# Altium schematic symbol library IC_ADI.SCHLIB: 3169 symbols (part 40 of 181)
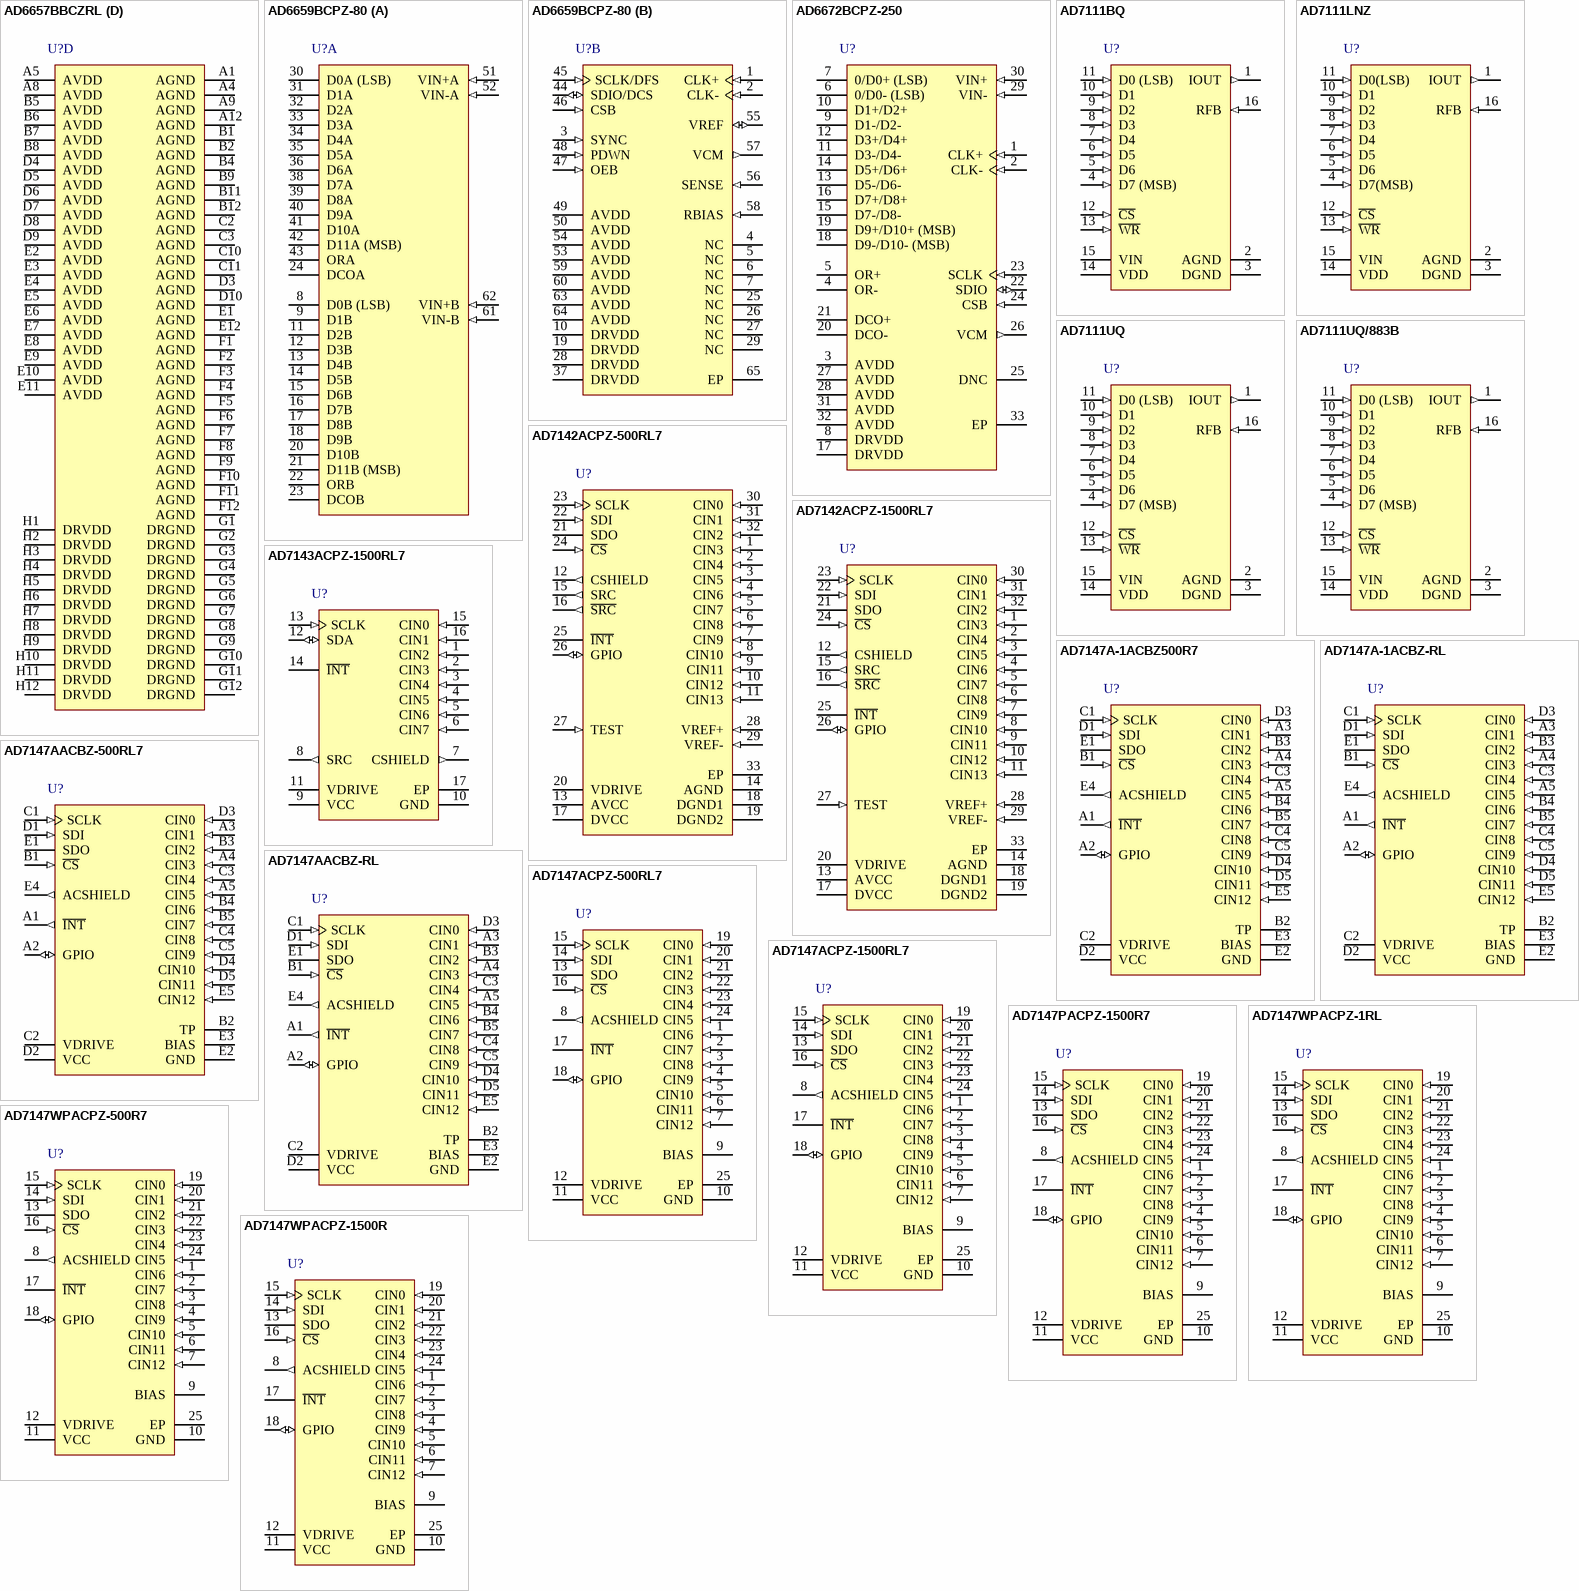
[diagram p230: symbols AD6657BBCZRL to AD7147WPACPZ-1500R]

## AD7147A-1ACBZ500R7
designator U?
13 Channel CapTouch Programmable Controller for Single-Electrode Capacitance Sensors, 111SPS, -40 to +85 degC, CB-25-3, Pb-Free, Reel; Generic Part Number: AD7147A; PartNumber: AD7147A-1ACBZ500R7; Resolution (Bits): 16; Channels: 13; Throughput Rate (SPS): 111; Interface: I2C/Ser 2-Wire, Ser, SPI; DatasheetVersion: Rev.B; PackageVersion: 081908-A; PackageReference: CB-25-3; PackageDescription: 25-Ball Wafer Level Chip Scale Package [WLCSP]; Supplier Part Number 1: AD7147A-1ACBZ500R7TR-ND; Supplier Part Number 2: AD7147A-1ACBZ500R7CT-ND; Supplier Part Number 3: AD7147A-1ACBZ500R7DKR-ND; Supplier Part Number 4: 05R6583; Supplier Part Number 5: 584-A7147A1ACBZ500R7; RoHS: Y; Packing: Reel; Mounting Technology: Surface Mount; ComponentLink1Description: Manufacturer URL; ComponentLink2Description: Datasheet; ComponentLink3Description: Package Specification; ComponentLink4Description: Product URL
footprint BGA25_0.4(2X2.2) (Footprint not found)
pins: A1 ~{INT} (out) "General-Purpose Open-Drain Interrupt Output. Programmable polarity; requires pull-up resistor.", A2 GPIO (io) "Programmable General-Purpose Input/Output.", A3 CIN1 (in) "Capacitance Sensor Input.", A4 CIN3 (in) "Capacitance Sensor Input.", A5 CIN5 (in) "Capacitance Sensor Input.", B1 ~{CS} (in) "SPI Chip Select Signal.", B2 TP (power) "Factory Test Point Only. Tie to ground.", B3 CIN2 (in) "Capacitance Sensor Input.", B4 CIN6 (in) "Capacitance Sensor Input.", B5 CIN7 (in) "Capacitance Sensor Input.", C1 SCLK (in) "Clock Input for Serial Interface.", C2 VDRIVE (power) "Serial Interface Operating Voltage Supply.", C3 CIN4 (in) "Capacitance Sensor Input.", C4 CIN8 (in) "Capacitance Sensor Input.", C5 CIN9 (in) "Capacitance Sensor Input.", D1 SDI (in) "SPI Serial Data Input.", D2 VCC (power) "Supply Voltage.", D3 CIN0 (in) "Capacitance Sensor Input.", D4 CIN10 (in) "Capacitance Sensor Input.", D5 CIN11 (in) "Capacitance Sensor Input.", E1 SDO (hiz) "SPI Serial Data Output.", E2 GND (power) "Ground Reference Point for All Circuitry.", E3 BIAS "Bias Node for Internal Circuitry. Requires 100 nF capacitor to ground.", E4 ACSHIELD (out) "CDC Active Shield Output. Connect to external shield or plane.", E5 CIN12 (in) "Capacitance Sensor Input."

## AD7147A-1ACBZ-RL
designator U?
13 Channel CapTouch Programmable Controller for Single-Electrode Capacitance Sensors, 111SPS, -40 to +85 degC, CB-25-3, Pb-Free, Reel; Generic Part Number: AD7147A; PartNumber: AD7147A-1ACBZ-RL; Resolution (Bits): 16; Channels: 13; Throughput Rate (SPS): 111; Interface: I2C/Ser 2-Wire, Ser, SPI; DatasheetVersion: Rev.B; PackageVersion: 081908-A; PackageReference: CB-25-3; PackageDescription: 25-Ball Wafer Level Chip Scale Package [WLCSP]; Supplier Part Number 1: AD7147A-1ACBZ-RL-ND; Supplier Part Number 2: 584-AD7147A-1ACBZ-R; RoHS: Y; Packing: Reel; Mounting Technology: Surface Mount; ComponentLink1Description: Manufacturer URL; ComponentLink2Description: Datasheet; ComponentLink3Description: Package Specification; ComponentLink4Description: Product URL
footprint BGA25_0.4(2X2.2) (Footprint not found)
pins: A1 ~{INT} (out) "General-Purpose Open-Drain Interrupt Output. Programmable polarity; requires pull-up resistor.", A2 GPIO (io) "Programmable General-Purpose Input/Output.", A3 CIN1 (in) "Capacitance Sensor Input.", A4 CIN3 (in) "Capacitance Sensor Input.", A5 CIN5 (in) "Capacitance Sensor Input.", B1 ~{CS} (in) "SPI Chip Select Signal.", B2 TP (power) "Factory Test Point Only. Tie to ground.", B3 CIN2 (in) "Capacitance Sensor Input.", B4 CIN6 (in) "Capacitance Sensor Input.", B5 CIN7 (in) "Capacitance Sensor Input.", C1 SCLK (in) "Clock Input for Serial Interface.", C2 VDRIVE (power) "Serial Interface Operating Voltage Supply.", C3 CIN4 (in) "Capacitance Sensor Input.", C4 CIN8 (in) "Capacitance Sensor Input.", C5 CIN9 (in) "Capacitance Sensor Input.", D1 SDI (in) "SPI Serial Data Input.", D2 VCC (power) "Supply Voltage.", D3 CIN0 (in) "Capacitance Sensor Input.", D4 CIN10 (in) "Capacitance Sensor Input.", D5 CIN11 (in) "Capacitance Sensor Input.", E1 SDO (hiz) "SPI Serial Data Output.", E2 GND (power) "Ground Reference Point for All Circuitry.", E3 BIAS "Bias Node for Internal Circuitry. Requires 100 nF capacitor to ground.", E4 ACSHIELD (out) "CDC Active Shield Output. Connect to external shield or plane.", E5 CIN12 (in) "Capacitance Sensor Input."

## AD7147AACBZ-500RL7
designator U?
13 Channel CapTouch Programmable Controller for Single-Electrode Capacitance Sensors, 111SPS, -40 to +85 degC, CB-25-3, Pb-Free, Reel; Generic Part Number: AD7147A; PartNumber: AD7147AACBZ-500RL7; Resolution (Bits): 16; Channels: 13; Throughput Rate (SPS): 111; Interface: I2C/Ser 2-Wire, Ser, SPI; DatasheetVersion: Rev.B; PackageVersion: 081908-A; PackageReference: CB-25-3; PackageDescription: 25-Ball Wafer Level Chip Scale Package [WLCSP]; Supplier Part Number 1: AD7147AACBZ-500RL7TR-ND; Supplier Part Number 2: AD7147AACBZ-500RL7CT-ND; Supplier Part Number 3: AD7147AACBZ-500RL7DKR-ND; Supplier Part Number 4: 05R6584; Supplier Part Number 5: 584-AD7147AACBZ500R7; RoHS: Y; Packing: Reel; Mounting Technology: Surface Mount; ComponentLink1Description: Manufacturer URL; ComponentLink2Description: Datasheet; ComponentLink3Description: Package Specification; ComponentLink4Description: Product URL
footprint BGA25_0.4(2X2.2) (Footprint not found)
pins: A1 ~{INT} (out) "General-Purpose Open-Drain Interrupt Output. Programmable polarity; requires pull-up resistor.", A2 GPIO (io) "Programmable General-Purpose Input/Output.", A3 CIN1 (in) "Capacitance Sensor Input.", A4 CIN3 (in) "Capacitance Sensor Input.", A5 CIN5 (in) "Capacitance Sensor Input.", B1 ~{CS} (in) "SPI Chip Select Signal.", B2 TP (power) "Factory Test Point Only. Tie to ground.", B3 CIN2 (in) "Capacitance Sensor Input.", B4 CIN6 (in) "Capacitance Sensor Input.", B5 CIN7 (in) "Capacitance Sensor Input.", C1 SCLK (in) "Clock Input for Serial Interface.", C2 VDRIVE (power) "Serial Interface Operating Voltage Supply.", C3 CIN4 (in) "Capacitance Sensor Input.", C4 CIN8 (in) "Capacitance Sensor Input.", C5 CIN9 (in) "Capacitance Sensor Input.", D1 SDI (in) "SPI Serial Data Input.", D2 VCC (power) "Supply Voltage.", D3 CIN0 (in) "Capacitance Sensor Input.", D4 CIN10 (in) "Capacitance Sensor Input.", D5 CIN11 (in) "Capacitance Sensor Input.", E1 SDO (hiz) "SPI Serial Data Output.", E2 GND (power) "Ground Reference Point for All Circuitry.", E3 BIAS "Bias Node for Internal Circuitry. Requires 100 nF capacitor to ground.", E4 ACSHIELD (out) "CDC Active Shield Output. Connect to external shield or plane.", E5 CIN12 (in) "Capacitance Sensor Input."

## AD7147AACBZ-RL
designator U?
13 Channel CapTouch Programmable Controller for Single-Electrode Capacitance Sensors, 111SPS, -40 to +85 degC, CB-25-3, Pb-Free, Reel; Generic Part Number: AD7147A; PartNumber: AD7147AACBZ-RL; Resolution (Bits): 16; Channels: 13; Throughput Rate (SPS): 111; Interface: I2C/Ser 2-Wire, Ser, SPI; DatasheetVersion: Rev.B; PackageVersion: 081908-A; PackageReference: CB-25-3; PackageDescription: 25-Ball Wafer Level Chip Scale Package [WLCSP]; Supplier Part Number 1: AD7147AACBZ-RL-ND; Supplier Part Number 2: 33R2708; Supplier Part Number 3: 584-AD7147AACBZ-R; RoHS: Y; Packing: Reel; Mounting Technology: Surface Mount; ComponentLink1Description: Manufacturer URL; ComponentLink2Description: Datasheet; ComponentLink3Description: Package Specification; ComponentLink4Description: Product URL
footprint BGA25_0.4(2X2.2) (Footprint not found)
pins: A1 ~{INT} (out) "General-Purpose Open-Drain Interrupt Output. Programmable polarity; requires pull-up resistor.", A2 GPIO (io) "Programmable General-Purpose Input/Output.", A3 CIN1 (in) "Capacitance Sensor Input.", A4 CIN3 (in) "Capacitance Sensor Input.", A5 CIN5 (in) "Capacitance Sensor Input.", B1 ~{CS} (in) "SPI Chip Select Signal.", B2 TP (power) "Factory Test Point Only. Tie to ground.", B3 CIN2 (in) "Capacitance Sensor Input.", B4 CIN6 (in) "Capacitance Sensor Input.", B5 CIN7 (in) "Capacitance Sensor Input.", C1 SCLK (in) "Clock Input for Serial Interface.", C2 VDRIVE (power) "Serial Interface Operating Voltage Supply.", C3 CIN4 (in) "Capacitance Sensor Input.", C4 CIN8 (in) "Capacitance Sensor Input.", C5 CIN9 (in) "Capacitance Sensor Input.", D1 SDI (in) "SPI Serial Data Input.", D2 VCC (power) "Supply Voltage.", D3 CIN0 (in) "Capacitance Sensor Input.", D4 CIN10 (in) "Capacitance Sensor Input.", D5 CIN11 (in) "Capacitance Sensor Input.", E1 SDO (hiz) "SPI Serial Data Output.", E2 GND (power) "Ground Reference Point for All Circuitry.", E3 BIAS "Bias Node for Internal Circuitry. Requires 100 nF capacitor to ground.", E4 ACSHIELD (out) "CDC Active Shield Output. Connect to external shield or plane.", E5 CIN12 (in) "Capacitance Sensor Input."

## AD7147ACPZ-500RL7
designator U?
13 Channel CapTouch Programmable Controller for Single-Electrode Capacitance Sensors, 111SPS, -40 to +85 degC, CP-24-3, Pb-Free, Reel; Generic Part Number: AD7147; PartNumber: AD7147ACPZ-500RL7; Resolution (Bits): 16; Channels: 13; Throughput Rate (SPS): 111; Interface: I2C/Ser 2-Wire, Ser, SPI; Automotive Qualified: Yes; DatasheetVersion: Rev.D; PackageVersion: Jan-2005; PackageReference: CP-24-3; PackageDescription: 24-Lead Lead Frame Chip Scale Package [LFCSP_VQ] 4 x 4 mm Body, Very Thin Quad; Supplier Part Number 1: AD7147ACPZ-500RL7TR-ND; Supplier Part Number 2: AD7147ACPZ-500RL7CT-ND; Supplier Part Number 3: AD7147ACPZ-500RL7DKR-ND; Supplier Part Number 4: 1699634; Supplier Part Number 5: 61M4035; Supplier Part Number 6: 584-AD7147ACPZ-500R7; RoHS: Y; Packing: Reel; Mounting Technology: Surface Mount; Code_JEDEC: MO-220-VGGD-8; ComponentLink1Description: Manufacturer URL; ComponentLink2Description: Datasheet; ComponentLink3Description: Package Specification; ComponentLink4Description: Product URL
footprint QFN24_0.5-PAD(4X4) (Footprint not found)
pins: 1 CIN6 (in) "Capacitance Sensor Input.", 2 CIN7 (in) "Capacitance Sensor Input.", 3 CIN8 (in) "Capacitance Sensor Input.", 4 CIN9 (in) "Capacitance Sensor Input.", 5 CIN10 (in) "Capacitance Sensor Input.", 6 CIN11 (in) "Capacitance Sensor Input.", 7 CIN12 (in) "Capacitance Sensor Input.", 8 ACSHIELD (out) "CDC Active Shield Output. Connect to external shield or plane.", 9 BIAS "Bias Node for Internal Circuitry. Requires 100 nF capacitor to ground.", 10 GND (power) "Ground Reference Point for All Circuitry.", 11 VCC (power) "Supply Voltage.", 12 VDRIVE (power) "Serial Interface Operating Voltage Supply.", 13 SDO (hiz) "SPI Serial Data Output.", 14 SDI (in) "SPI Serial Data Input.", 15 SCLK (in) "Clock Input for Serial Interface.", 16 ~{CS} (in) "SPI Chip Select Signal.", 17 ~{INT} (oc) "General-Purpose Open-Drain Interrupt Output. Programmable polarity; requires pull-up resistor.", 18 GPIO (io) "Programmable GPIO.", 19 CIN0 (in) "Capacitance Sensor Input.", 20 CIN1 (in) "Capacitance Sensor Input.", 21 CIN2 (in) "Capacitance Sensor Input.", 22 CIN3 (in) "Capacitance Sensor Input.", 23 CIN4 (in) "Capacitance Sensor Input.", 24 CIN5 (in) "Capacitance Sensor Input.", 25 EP (power) "Capacitance Sensor Input."

## AD7147ACPZ-1500RL7
designator U?
13 Channel CapTouch Programmable Controller for Single-Electrode Capacitance Sensors, 111SPS, -40 to +85 degC, CP-24-3, Pb-Free, Reel; Generic Part Number: AD7147; PartNumber: AD7147ACPZ-1500RL7; Resolution (Bits): 16; Channels: 13; Throughput Rate (SPS): 111; Interface: I2C/Ser 2-Wire, Ser, SPI; Automotive Qualified: Yes; DatasheetVersion: Rev.D; PackageVersion: Jan-2005; PackageReference: CP-24-3; PackageDescription: 24-Lead Lead Frame Chip Scale Package [LFCSP_VQ] 4 x 4 mm Body, Very Thin Quad; Supplier Part Number 1: AD7147ACPZ-1500RL7TR-ND; Supplier Part Number 2: AD7147ACPZ-1500RL7CT-ND; Supplier Part Number 3: AD7147ACPZ-1500RL7DKR-ND; Supplier Part Number 4: 1838856; Supplier Part Number 5: 61M4034; Supplier Part Number 6: 584-AD7147ACPZ1500R7; RoHS: Y; Packing: Reel; Mounting Technology: Surface Mount; Code_JEDEC: MO-220-VGGD-8; ComponentLink1Description: Manufacturer URL; ComponentLink2Description: Datasheet; ComponentLink3Description: Package Specification; ComponentLink4Description: Product URL
footprint QFN24_0.5-PAD(4X4) (Footprint not found)
pins: 1 CIN6 (in) "Capacitance Sensor Input.", 2 CIN7 (in) "Capacitance Sensor Input.", 3 CIN8 (in) "Capacitance Sensor Input.", 4 CIN9 (in) "Capacitance Sensor Input.", 5 CIN10 (in) "Capacitance Sensor Input.", 6 CIN11 (in) "Capacitance Sensor Input.", 7 CIN12 (in) "Capacitance Sensor Input.", 8 ACSHIELD (out) "CDC Active Shield Output. Connect to external shield or plane.", 9 BIAS "Bias Node for Internal Circuitry. Requires 100 nF capacitor to ground.", 10 GND (power) "Ground Reference Point for All Circuitry.", 11 VCC (power) "Supply Voltage.", 12 VDRIVE (power) "Serial Interface Operating Voltage Supply.", 13 SDO (hiz) "SPI Serial Data Output.", 14 SDI (in) "SPI Serial Data Input.", 15 SCLK (in) "Clock Input for Serial Interface.", 16 ~{CS} (in) "SPI Chip Select Signal.", 17 ~{INT} (oc) "General-Purpose Open-Drain Interrupt Output. Programmable polarity; requires pull-up resistor.", 18 GPIO (io) "Programmable GPIO.", 19 CIN0 (in) "Capacitance Sensor Input.", 20 CIN1 (in) "Capacitance Sensor Input.", 21 CIN2 (in) "Capacitance Sensor Input.", 22 CIN3 (in) "Capacitance Sensor Input.", 23 CIN4 (in) "Capacitance Sensor Input.", 24 CIN5 (in) "Capacitance Sensor Input.", 25 EP (power) "Capacitance Sensor Input."

## AD7147PACPZ-1500R7
designator U?
13 Channel CapTouch Programmable Controller for Single-Electrode Capacitance Sensors, 111SPS, -40 to +85 degC, CP-24-3, Pb-Free, Reel; Generic Part Number: AD7147; PartNumber: AD7147PACPZ-1500R7; Resolution (Bits): 16; Channels: 13; Throughput Rate (SPS): 111; Interface: I2C/Ser 2-Wire, Ser, SPI; Automotive Qualified: Yes; DatasheetVersion: Rev.D; PackageVersion: Jan-2005; PackageReference: CP-24-3; PackageDescription: 24-Lead Lead Frame Chip Scale Package [LFCSP_VQ] 4 x 4 mm Body, Very Thin Quad; Supplier Part Number 1: AD7147PACPZ-1500R7TR-ND; Supplier Part Number 2: AD7147PACPZ-1500R7CT-ND; Supplier Part Number 3: AD7147PACPZ-1500R7DKR-ND; Supplier Part Number 4: 584-A7147PACPZ1500R7; RoHS: Y; Packing: Reel; Mounting Technology: Surface Mount; Code_JEDEC: MO-220-VGGD-8; ComponentLink1Description: Manufacturer URL; ComponentLink2Description: Datasheet; ComponentLink3Description: Package Specification; ComponentLink4Description: Product URL
footprint QFN24_0.5-PAD(4X4) (Footprint not found)
pins: 1 CIN6 (in) "Capacitance Sensor Input.", 2 CIN7 (in) "Capacitance Sensor Input.", 3 CIN8 (in) "Capacitance Sensor Input.", 4 CIN9 (in) "Capacitance Sensor Input.", 5 CIN10 (in) "Capacitance Sensor Input.", 6 CIN11 (in) "Capacitance Sensor Input.", 7 CIN12 (in) "Capacitance Sensor Input.", 8 ACSHIELD (out) "CDC Active Shield Output. Connect to external shield or plane.", 9 BIAS "Bias Node for Internal Circuitry. Requires 100 nF capacitor to ground.", 10 GND (power) "Ground Reference Point for All Circuitry.", 11 VCC (power) "Supply Voltage.", 12 VDRIVE (power) "Serial Interface Operating Voltage Supply.", 13 SDO (hiz) "SPI Serial Data Output.", 14 SDI (in) "SPI Serial Data Input.", 15 SCLK (in) "Clock Input for Serial Interface.", 16 ~{CS} (in) "SPI Chip Select Signal.", 17 ~{INT} (oc) "General-Purpose Open-Drain Interrupt Output. Programmable polarity; requires pull-up resistor.", 18 GPIO (io) "Programmable GPIO.", 19 CIN0 (in) "Capacitance Sensor Input.", 20 CIN1 (in) "Capacitance Sensor Input.", 21 CIN2 (in) "Capacitance Sensor Input.", 22 CIN3 (in) "Capacitance Sensor Input.", 23 CIN4 (in) "Capacitance Sensor Input.", 24 CIN5 (in) "Capacitance Sensor Input.", 25 EP (power) "Capacitance Sensor Input."

## AD7147WPACPZ-1RL
designator U?
13 Channel CapTouch Programmable Controller for Single-Electrode Capacitance Sensors, 111SPS, -40 to +85 degC, CP-24-3, Pb-Free, Reel; Generic Part Number: AD7147; PartNumber: AD7147WPACPZ-1RL; Resolution (Bits): 16; Channels: 13; Throughput Rate (SPS): 111; Interface: I2C/Ser 2-Wire, Ser, SPI; Automotive Qualified: Yes; DatasheetVersion: Rev.D; PackageVersion: Jan-2005; PackageReference: CP-24-3; PackageDescription: 24-Lead Lead Frame Chip Scale Package [LFCSP_VQ] 4 x 4 mm Body, Very Thin Quad; Supplier Part Number 1: AD7147WPACPZ-1RL-ND; Supplier Part Number 2: 584-AD7147WPACPZ-1R; RoHS: Y; Packing: Reel; Mounting Technology: Surface Mount; Code_JEDEC: MO-220-VGGD-8; ComponentLink1Description: Manufacturer URL; ComponentLink2Description: Datasheet; ComponentLink3Description: Package Specification; ComponentLink4Description: Product URL
footprint QFN24_0.5-PAD(4X4) (Footprint not found)
pins: 1 CIN6 (in) "Capacitance Sensor Input.", 2 CIN7 (in) "Capacitance Sensor Input.", 3 CIN8 (in) "Capacitance Sensor Input.", 4 CIN9 (in) "Capacitance Sensor Input.", 5 CIN10 (in) "Capacitance Sensor Input.", 6 CIN11 (in) "Capacitance Sensor Input.", 7 CIN12 (in) "Capacitance Sensor Input.", 8 ACSHIELD (out) "CDC Active Shield Output. Connect to external shield or plane.", 9 BIAS "Bias Node for Internal Circuitry. Requires 100 nF capacitor to ground.", 10 GND (power) "Ground Reference Point for All Circuitry.", 11 VCC (power) "Supply Voltage.", 12 VDRIVE (power) "Serial Interface Operating Voltage Supply.", 13 SDO (hiz) "SPI Serial Data Output.", 14 SDI (in) "SPI Serial Data Input.", 15 SCLK (in) "Clock Input for Serial Interface.", 16 ~{CS} (in) "SPI Chip Select Signal.", 17 ~{INT} (oc) "General-Purpose Open-Drain Interrupt Output. Programmable polarity; requires pull-up resistor.", 18 GPIO (io) "Programmable GPIO.", 19 CIN0 (in) "Capacitance Sensor Input.", 20 CIN1 (in) "Capacitance Sensor Input.", 21 CIN2 (in) "Capacitance Sensor Input.", 22 CIN3 (in) "Capacitance Sensor Input.", 23 CIN4 (in) "Capacitance Sensor Input.", 24 CIN5 (in) "Capacitance Sensor Input.", 25 EP (power) "Capacitance Sensor Input."

## AD7147WPACPZ-500R7
designator U?
13 Channel CapTouch Programmable Controller for Single-Electrode Capacitance Sensors, 111SPS, -40 to +85 degC, CP-24-3, Pb-Free, Reel; Generic Part Number: AD7147; PartNumber: AD7147WPACPZ-500R7; Resolution (Bits): 16; Channels: 13; Throughput Rate (SPS): 111; Interface: I2C/Ser 2-Wire, Ser, SPI; Automotive Qualified: Yes; DatasheetVersion: Rev.D; PackageVersion: Jan-2005; PackageReference: CP-24-3; PackageDescription: 24-Lead Lead Frame Chip Scale Package [LFCSP_VQ] 4 x 4 mm Body, Very Thin Quad; Supplier Part Number 1: AD7147WPACPZ-500R7-ND; Supplier Part Number 2: 584-A7147WPACPZ500R7; RoHS: Y; Packing: Reel; Mounting Technology: Surface Mount; Code_JEDEC: MO-220-VGGD-8; ComponentLink1Description: Manufacturer URL; ComponentLink2Description: Datasheet; ComponentLink3Description: Package Specification; ComponentLink4Description: Product URL
footprint QFN24_0.5-PAD(4X4) (Footprint not found)
pins: 1 CIN6 (in) "Capacitance Sensor Input.", 2 CIN7 (in) "Capacitance Sensor Input.", 3 CIN8 (in) "Capacitance Sensor Input.", 4 CIN9 (in) "Capacitance Sensor Input.", 5 CIN10 (in) "Capacitance Sensor Input.", 6 CIN11 (in) "Capacitance Sensor Input.", 7 CIN12 (in) "Capacitance Sensor Input.", 8 ACSHIELD (out) "CDC Active Shield Output. Connect to external shield or plane.", 9 BIAS "Bias Node for Internal Circuitry. Requires 100 nF capacitor to ground.", 10 GND (power) "Ground Reference Point for All Circuitry.", 11 VCC (power) "Supply Voltage.", 12 VDRIVE (power) "Serial Interface Operating Voltage Supply.", 13 SDO (hiz) "SPI Serial Data Output.", 14 SDI (in) "SPI Serial Data Input.", 15 SCLK (in) "Clock Input for Serial Interface.", 16 ~{CS} (in) "SPI Chip Select Signal.", 17 ~{INT} (oc) "General-Purpose Open-Drain Interrupt Output. Programmable polarity; requires pull-up resistor.", 18 GPIO (io) "Programmable GPIO.", 19 CIN0 (in) "Capacitance Sensor Input.", 20 CIN1 (in) "Capacitance Sensor Input.", 21 CIN2 (in) "Capacitance Sensor Input.", 22 CIN3 (in) "Capacitance Sensor Input.", 23 CIN4 (in) "Capacitance Sensor Input.", 24 CIN5 (in) "Capacitance Sensor Input.", 25 EP (power) "Capacitance Sensor Input."

## AD7147WPACPZ-1500R
designator U?
13 Channel CapTouch Programmable Controller for Single-Electrode Capacitance Sensors, 111SPS, -40 to +85 degC, CP-24-3, Pb-Free, Reel; Generic Part Number: AD7147; PartNumber: AD7147WPACPZ-1500R; Resolution (Bits): 16; Channels: 13; Throughput Rate (SPS): 111; Interface: I2C/Ser 2-Wire, Ser, SPI; Automotive Qualified: Yes; DatasheetVersion: Rev.D; PackageVersion: Jan-2005; PackageReference: CP-24-3; PackageDescription: 24-Lead Lead Frame Chip Scale Package [LFCSP_VQ] 4 x 4 mm Body, Very Thin Quad; Supplier Part Number 1: AD7147WPACPZ-1500R-ND; Supplier Part Number 2: 584-A7147WPACPZ1500R; RoHS: Y; Packing: Reel; Mounting Technology: Surface Mount; Code_JEDEC: MO-220-VGGD-8; ComponentLink1Description: Manufacturer URL; ComponentLink2Description: Datasheet; ComponentLink3Description: Package Specification; ComponentLink4Description: Product URL
footprint QFN24_0.5-PAD(4X4) (Footprint not found)
pins: 1 CIN6 (in) "Capacitance Sensor Input.", 2 CIN7 (in) "Capacitance Sensor Input.", 3 CIN8 (in) "Capacitance Sensor Input.", 4 CIN9 (in) "Capacitance Sensor Input.", 5 CIN10 (in) "Capacitance Sensor Input.", 6 CIN11 (in) "Capacitance Sensor Input.", 7 CIN12 (in) "Capacitance Sensor Input.", 8 ACSHIELD (out) "CDC Active Shield Output. Connect to external shield or plane.", 9 BIAS "Bias Node for Internal Circuitry. Requires 100 nF capacitor to ground.", 10 GND (power) "Ground Reference Point for All Circuitry.", 11 VCC (power) "Supply Voltage.", 12 VDRIVE (power) "Serial Interface Operating Voltage Supply.", 13 SDO (hiz) "SPI Serial Data Output.", 14 SDI (in) "SPI Serial Data Input.", 15 SCLK (in) "Clock Input for Serial Interface.", 16 ~{CS} (in) "SPI Chip Select Signal.", 17 ~{INT} (oc) "General-Purpose Open-Drain Interrupt Output. Programmable polarity; requires pull-up resistor.", 18 GPIO (io) "Programmable GPIO.", 19 CIN0 (in) "Capacitance Sensor Input.", 20 CIN1 (in) "Capacitance Sensor Input.", 21 CIN2 (in) "Capacitance Sensor Input.", 22 CIN3 (in) "Capacitance Sensor Input.", 23 CIN4 (in) "Capacitance Sensor Input.", 24 CIN5 (in) "Capacitance Sensor Input.", 25 EP (power) "Capacitance Sensor Input."
